# Altium schematic symbol library Regulator_Switching.SchLib: 1120 symbols (part 1 of 8) (continued)
## CRE1S0505SC (continued)
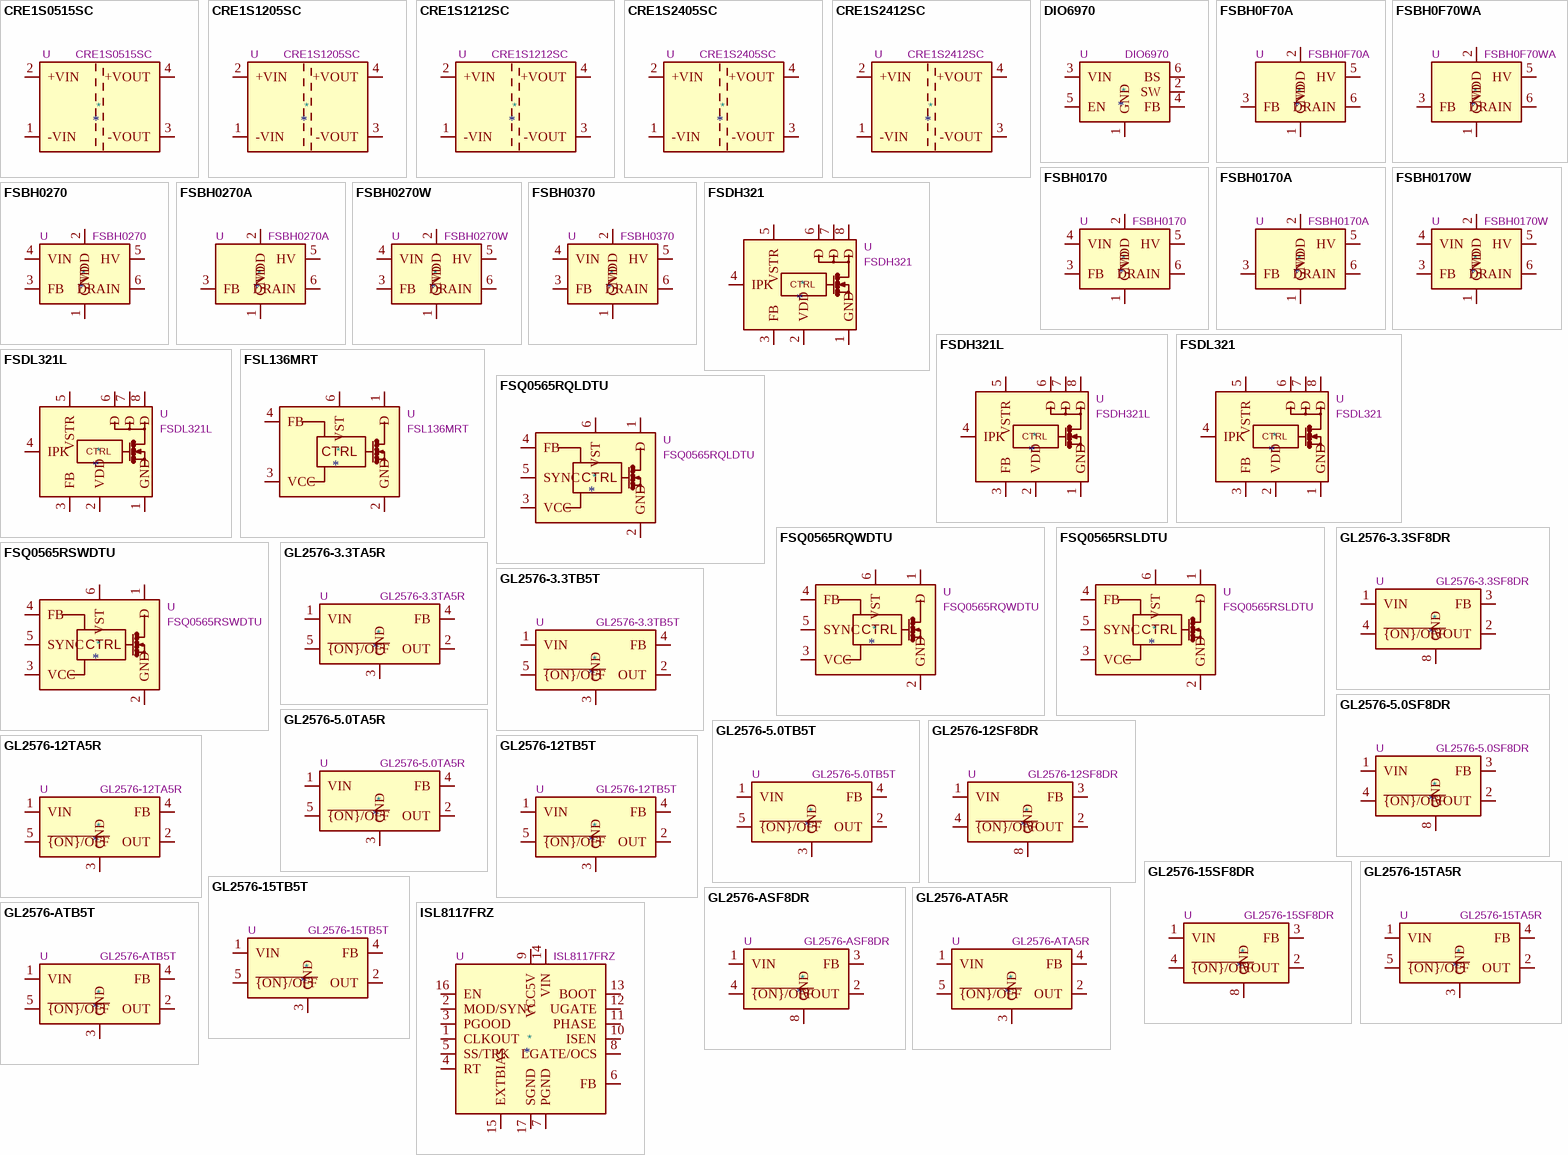
[diagram p2: symbols CRE1S0515SC to ISL8117FRZ]

## CRE1S0515SC
designator *  value CRE1S0515SC  Reference: U
ki_keywords: Murata isolated isolation dc-dc converter transformer; ki_description: 15V to 5V 67mA DC-DC Converter with 1kV isolation, SIP-4; ki_fp_filters: Converter*DCDC*Murata*CRE1xxxxxxSC*; Footprint: Converter_DCDC:Converter_DCDC_Murata_CRE1xxxxxxSC_THT; Datasheet: http://power.murata.com/datasheet?/data/power/ncl/kdc_cre1.pdf
pins: 1 -VIN, 2 +VIN, 3 -VOUT, 4 +VOUT

## CRE1S1205SC
designator *  value CRE1S1205SC  Reference: U
ki_keywords: Murata isolated isolation dc-dc converter transformer; ki_description: 12V to 5V 200mA DC-DC Converter with 1kV isolation, SIP-4; ki_fp_filters: Converter*DCDC*Murata*CRE1xxxxxxSC*; Footprint: Converter_DCDC:Converter_DCDC_Murata_CRE1xxxxxxSC_THT; Datasheet: http://power.murata.com/datasheet?/data/power/ncl/kdc_cre1.pdf
pins: 1 -VIN, 2 +VIN, 3 -VOUT, 4 +VOUT

## CRE1S1212SC
designator *  value CRE1S1212SC  Reference: U
ki_keywords: Murata isolated isolation dc-dc converter transformer; ki_description: 12V to 12V 83mA DC-DC Converter with 1kV isolation, SIP-4; ki_fp_filters: Converter*DCDC*Murata*CRE1xxxxxxSC*; Footprint: Converter_DCDC:Converter_DCDC_Murata_CRE1xxxxxxSC_THT; Datasheet: http://power.murata.com/datasheet?/data/power/ncl/kdc_cre1.pdf
pins: 1 -VIN, 2 +VIN, 3 -VOUT, 4 +VOUT

## CRE1S2405SC
designator *  value CRE1S2405SC  Reference: U
ki_keywords: Murata isolated isolation dc-dc converter transformer; ki_description: 24V to 5V 200mA DC-DC Converter with 1kV isolation, SIP-4; ki_fp_filters: Converter*DCDC*Murata*CRE1xxxxxxSC*; Footprint: Converter_DCDC:Converter_DCDC_Murata_CRE1xxxxxxSC_THT; Datasheet: http://power.murata.com/datasheet?/data/power/ncl/kdc_cre1.pdf
pins: 1 -VIN, 2 +VIN, 3 -VOUT, 4 +VOUT

## CRE1S2412SC
designator *  value CRE1S2412SC  Reference: U
ki_keywords: Murata isolated isolation dc-dc converter transformer; ki_description: 24V to 12V 83mA DC-DC Converter with 1kV isolation, SIP-4; ki_fp_filters: Converter*DCDC*Murata*CRE1xxxxxxSC*; Footprint: Converter_DCDC:Converter_DCDC_Murata_CRE1xxxxxxSC_THT; Datasheet: http://power.murata.com/datasheet?/data/power/ncl/kdc_cre1.pdf
pins: 1 -VIN, 2 +VIN, 3 -VOUT, 4 +VOUT

## DIO6970
designator *  value DIO6970  Reference: U
ki_keywords: smps buck boost inverting; ki_description: High-Efficiency 2A, 24V Input Synchronous Step Down Converter, SOT-23-6; ki_fp_filters: SOT?23*; Footprint: Package_TO_SOT_SMD:SOT-23-6; Datasheet: http://www.dioo.com/uploads/product/20190313/7a4d03690a9be004035eb1035a429f24.pdf
pins: 1 GND, 2 SW, 3 VIN, 4 FB, 5 EN, 6 BS

## FSBH0F70A
designator *  value FSBH0F70A  Reference: U
ki_keywords: smps regulator; ki_description: Green Mode Fairchild Power Switch, 700V Vds, 0.5A Id, 10W/8W 230V/85-265V, DIP-8; ki_fp_filters: DIP*W7.62mm*; Footprint: Package_DIP:DIP-8_W7.62mm; Datasheet: https://www.onsemi.com/pub/Collateral/FSBH0270-D.PDF
pins: 1 GND, 2 VDD, 3 FB, 4 NC hidden, 5 HV, 6 DRAIN, 7 DRAIN hidden, 8 DRAIN hidden

## FSBH0F70WA
designator *  value FSBH0F70WA  Reference: U
ki_keywords: smps regulator; ki_description: Green Mode Fairchild Power Switch, 700V Vds, 0.5A Id, 10W/8W 230V/85-265V, DIP-8; ki_fp_filters: DIP*W7.62mm*; Footprint: Package_DIP:DIP-8_W7.62mm; Datasheet: http://www.onsemi.com/pub/Collateral/FSBH0270W-D.pdf
pins: 1 GND, 2 VDD, 3 FB, 4 NC hidden, 5 HV, 6 DRAIN, 7 DRAIN hidden, 8 DRAIN hidden

## FSBH0170
designator *  value FSBH0170  Reference: U
ki_keywords: smps regulator; ki_description: Green Mode Fairchild Power Switch, 700V Vds, 1.0A Id, 15W/13W 230V/85-265V, VIN Pin, DIP-8; ki_fp_filters: DIP*W7.62mm*; Footprint: Package_DIP:DIP-8_W7.62mm; Datasheet: https://www.onsemi.com/pub/Collateral/FSBH0270-D.PDF
pins: 1 GND, 2 VDD, 3 FB, 4 VIN, 5 HV, 6 DRAIN, 7 DRAIN hidden, 8 DRAIN hidden

## FSBH0170A
designator *  value FSBH0170A  Reference: U
ki_keywords: smps regulator; ki_description: Green Mode Fairchild Power Switch, 700V Vds, 1.0A Id, 15W/13W 230V/85-265V, DIP-8; ki_fp_filters: DIP*W7.62mm*; Footprint: Package_DIP:DIP-8_W7.62mm; Datasheet: https://www.onsemi.com/pub/Collateral/FSBH0270-D.PDF
pins: 1 GND, 2 VDD, 3 FB, 4 NC hidden, 5 HV, 6 DRAIN, 7 DRAIN hidden, 8 DRAIN hidden

## FSBH0170W
designator *  value FSBH0170W  Reference: U
ki_keywords: smps regulator; ki_description: Green Mode Fairchild Power Switch, 700V Vds, 1.0A Id, 15W/13W 230V/85-265V, VIN Pin, DIP-8; ki_fp_filters: DIP*W7.62mm*; Footprint: Package_DIP:DIP-8_W7.62mm; Datasheet: http://www.onsemi.com/pub/Collateral/FSBH0270W-D.pdf
pins: 1 GND, 2 VDD, 3 FB, 4 VIN, 5 HV, 6 DRAIN, 7 DRAIN hidden, 8 DRAIN hidden

## FSBH0270
designator *  value FSBH0270  Reference: U
ki_keywords: smps regulator; ki_description: Green Mode Fairchild Power Switch, 700V Vds, 2.0A Id, 20W/16W 230V/85-265V, VIN Pin, DIP-8; ki_fp_filters: DIP*W7.62mm*; Footprint: Package_DIP:DIP-8_W7.62mm; Datasheet: https://www.onsemi.com/pub/Collateral/FSBH0270-D.PDF
pins: 1 GND, 2 VDD, 3 FB, 4 VIN, 5 HV, 6 DRAIN, 7 DRAIN hidden, 8 DRAIN hidden

## FSBH0270A
designator *  value FSBH0270A  Reference: U
ki_keywords: smps regulator; ki_description: Green Mode Fairchild Power Switch, 700V Vds, 2.0A Id, 20W/16W 230V/85-265V, DIP-8; ki_fp_filters: DIP*W7.62mm*; Footprint: Package_DIP:DIP-8_W7.62mm; Datasheet: https://www.onsemi.com/pub/Collateral/FSBH0270-D.PDF
pins: 1 GND, 2 VDD, 3 FB, 4 NC hidden, 5 HV, 6 DRAIN, 7 DRAIN hidden, 8 DRAIN hidden

## FSBH0270W
designator *  value FSBH0270W  Reference: U
ki_keywords: smps regulator; ki_description: Green Mode Fairchild Power Switch, 700V Vds, 2.0A Id, 20W/16W 230V/85-265V, VIN Pin, DIP-8; ki_fp_filters: DIP*W7.62mm*; Footprint: Package_DIP:DIP-8_W7.62mm; Datasheet: http://www.onsemi.com/pub/Collateral/FSBH0270W-D.pdf
pins: 1 GND, 2 VDD, 3 FB, 4 VIN, 5 HV, 6 DRAIN, 7 DRAIN hidden, 8 DRAIN hidden

## FSBH0370
designator *  value FSBH0370  Reference: U
ki_keywords: smps regulator; ki_description: Green Mode Fairchild Power Switch, 700V Vds, 3.0A Id, 25W/19W 230V/85-265V, VIN Pin, DIP-8; ki_fp_filters: DIP*W7.62mm*; Footprint: Package_DIP:DIP-8_W7.62mm; Datasheet: https://www.onsemi.com/pub/Collateral/FSBH0270-D.PDF
pins: 1 GND, 2 VDD, 3 FB, 4 VIN, 5 HV, 6 DRAIN, 7 DRAIN hidden, 8 DRAIN hidden

## FSDH321
designator *  value FSDH321  Reference: U
ki_keywords: SMPS Controller with MOSFET 17W AC-DC; ki_description: 17W SMPS Controller, 100kHz, AC-DC, PDIP-8; ki_fp_filters: DIP*W7.62mm*; Footprint: Package_DIP:DIP-8_W7.62mm; Datasheet: https://www.onsemi.com/pub/Collateral/FSDH321JP-D.pdf
pins: 1 GND, 2 VDD, 3 FB, 4 IPK, 5 VSTR, 6 D, 7 D, 8 D
text: CTRL

## FSDH321L
designator *  value FSDH321L  Reference: U
ki_keywords: SMPS Controller with MOSFET 17W AC-DC; ki_description: 17W SMPS Controller, 100kHz, AC-DC, SMD-8; ki_fp_filters: Fairchild*LSOP*; Footprint: Package_DIP:Fairchild_LSOP-8; Datasheet: https://www.onsemi.com/pub/Collateral/FSDH321JP-D.pdf
pins: 1 GND, 2 VDD, 3 FB, 4 IPK, 5 VSTR, 6 D, 7 D, 8 D
text: CTRL

## FSDL321
designator *  value FSDL321  Reference: U
ki_keywords: SMPS Controller with MOSFET 17W AC-DC; ki_description: 17W SMPS Controller, 50kHz, AC-DC, PDIP-8; ki_fp_filters: DIP*W7.62mm*; Footprint: Package_DIP:DIP-8_W7.62mm; Datasheet: https://www.onsemi.com/pub/Collateral/FSDH321JP-D.pdf
pins: 1 GND, 2 VDD, 3 FB, 4 IPK, 5 VSTR, 6 D, 7 D, 8 D
text: CTRL

## FSDL321L
designator *  value FSDL321L  Reference: U
ki_keywords: SMPS Controller with MOSFET 17W AC-DC; ki_description: 17W SMPS Controller, 50kHz, AC-DC, SMD-8; ki_fp_filters: Fairchild*LSOP*; Footprint: Package_DIP:Fairchild_LSOP-8; Datasheet: https://www.onsemi.com/pub/Collateral/FSDH321JP-D.pdf
pins: 1 GND, 2 VDD, 3 FB, 4 IPK, 5 VSTR, 6 D, 7 D, 8 D
text: CTRL

## FSL136MRT
designator *  value FSL136MRT  Reference: U
ki_keywords: SMPS Controller 50W AC-DC; ki_description: 67kHz SMPS Controller w/ Soft Start, max. 50W AC-DC, TO-220F-6L; ki_fp_filters: Fairchild*TO*220F*6L*; Footprint: Package_TO_SOT_THT:Fairchild_TO-220F-6L; Datasheet: https://www.onsemi.com/pub/Collateral/FSL136MRT-D.pdf
pins: 1 D, 2 GND, 3 VCC, 4 FB, 6 VST
text: CTRL

## FSQ0565RQLDTU
designator *  value FSQ0565RQLDTU  Reference: U
ki_keywords: Quasi Resonant SMPS Controller 80W AC-DC; ki_description: 67kHz Quasi Resonant SMPS Controller w/ Soft Start, max. 80W AC-DC, TO-220F-6L (Formed); ki_fp_filters: Fairchild*TO*220F*6L*; Footprint: Package_TO_SOT_THT:Fairchild_TO-220F-6L; Datasheet: http://www.onsemi.com/pub/Collateral/FSQ0565RS-D.PDF
pins: 1 D, 2 GND, 3 VCC, 4 FB, 5 SYNC, 6 VST
text: CTRL

## FSQ0565RQWDTU
designator *  value FSQ0565RQWDTU  Reference: U
ki_keywords: Quasi Resonant SMPS Controller 80W AC-DC; ki_description: 67kHz Quasi Resonant SMPS Controller w/ Soft Start, max. 80W AC-DC, TO-220F-6L; ki_fp_filters: Fairchild*TO*220F*6L*; Footprint: Package_TO_SOT_THT:Fairchild_TO-220F-6L; Datasheet: http://www.onsemi.com/pub/Collateral/FSQ0565RS-D.PDF
pins: 1 D, 2 GND, 3 VCC, 4 FB, 5 SYNC, 6 VST
text: CTRL

## FSQ0565RSLDTU
designator *  value FSQ0565RSLDTU  Reference: U
ki_keywords: Quasi Resonant SMPS Controller 80W AC-DC; ki_description: 67kHz Quasi Resonant SMPS Controller w/ Soft Start, max. 80W AC-DC, TO-220F-6L (Formed); ki_fp_filters: Fairchild*TO*220F*6L*; Footprint: Package_TO_SOT_THT:Fairchild_TO-220F-6L; Datasheet: http://www.onsemi.com/pub/Collateral/FSQ0565RS-D.PDF
pins: 1 D, 2 GND, 3 VCC, 4 FB, 5 SYNC, 6 VST
text: CTRL

## FSQ0565RSWDTU
designator *  value FSQ0565RSWDTU  Reference: U
ki_keywords: Quasi Resonant SMPS Controller 80W AC-DC; ki_description: 67kHz Quasi Resonant SMPS Controller w/ Soft Start, max. 80W AC-DC, TO-220F-6L; ki_fp_filters: Fairchild*TO*220F*6L*; Footprint: Package_TO_SOT_THT:Fairchild_TO-220F-6L; Datasheet: http://www.onsemi.com/pub/Collateral/FSQ0565RS-D.PDF
pins: 1 D, 2 GND, 3 VCC, 4 FB, 5 SYNC, 6 VST
text: CTRL

## GL2576-3.3SF8DR
designator *  value GL2576-3.3SF8DR  Reference: U
ki_keywords: 3.3V 3A 52KHz Buck DC/DC; ki_description: 3.3V 3A, 52KHz Step Down Converter, SO-8; ki_fp_filters: SOIC*3.9x4.9mm*P1.27mm*; Footprint: Package_SO:SOIC-8_3.9x4.9mm_P1.27mm; Datasheet: http://www.dianyuan.com/bbs/u/54/437861181916300.pdf
pins: 1 VIN, 2 VOUT, 3 FB, 4 ~{{ON}/OFF}, 5 GND hidden, 6 GND hidden, 7 GND hidden, 8 GND

## GL2576-3.3TA5R
designator *  value GL2576-3.3TA5R  Reference: U
ki_keywords: 3.3V 3A 52KHz Buck DC/DC; ki_description: 3.3V 3A, 52KHz Step Down Converter, TO263-5 (D2-PAK); ki_fp_filters: TO?263*; Footprint: Package_TO_SOT_SMD:TO-263-5_TabPin3; Datasheet: http://www.dianyuan.com/bbs/u/54/437861181916300.pdf
pins: 1 VIN, 2 OUT, 3 GND, 4 FB, 5 ~{{ON}/OFF}

## GL2576-3.3TB5T
designator *  value GL2576-3.3TB5T  Reference: U
ki_keywords: 3.3V 3A 52KHz Buck DC/DC; ki_description: 3.3V 3A, 52KHz Step Down Converter, TO220-5; ki_fp_filters: TO?220*; Footprint: Package_TO_SOT_THT:TO-220-5_Vertical; Datasheet: http://www.dianyuan.com/bbs/u/54/437861181916300.pdf
pins: 1 VIN, 2 OUT, 3 GND, 4 FB, 5 ~{{ON}/OFF}

## GL2576-5.0SF8DR
designator *  value GL2576-5.0SF8DR  Reference: U
ki_keywords: 5V 3A 52KHz Buck DC/DC; ki_description: 5V 3A, 52KHz Step Down Converter, SO-8; ki_fp_filters: SOIC*3.9x4.9mm*P1.27mm*; Footprint: Package_SO:SOIC-8_3.9x4.9mm_P1.27mm; Datasheet: http://www.dianyuan.com/bbs/u/54/437861181916300.pdf
pins: 1 VIN, 2 VOUT, 3 FB, 4 ~{{ON}/OFF}, 5 GND hidden, 6 GND hidden, 7 GND hidden, 8 GND

## GL2576-5.0TA5R
designator *  value GL2576-5.0TA5R  Reference: U
ki_keywords: 5V 3A 52KHz Buck DC/DC; ki_description: 5V 3A, 52KHz Step Down Converter, TO263-5 (D2-PAK); ki_fp_filters: TO?263*; Footprint: Package_TO_SOT_SMD:TO-263-5_TabPin3; Datasheet: http://www.dianyuan.com/bbs/u/54/437861181916300.pdf
pins: 1 VIN, 2 OUT, 3 GND, 4 FB, 5 ~{{ON}/OFF}

## GL2576-5.0TB5T
designator *  value GL2576-5.0TB5T  Reference: U
ki_keywords: 5V 3A 52KHz Buck DC/DC; ki_description: 5V 3A, 52KHz Step Down Converter, TO220-5; ki_fp_filters: TO?220*; Footprint: Package_TO_SOT_THT:TO-220-5_Vertical; Datasheet: http://www.dianyuan.com/bbs/u/54/437861181916300.pdf
pins: 1 VIN, 2 OUT, 3 GND, 4 FB, 5 ~{{ON}/OFF}

## GL2576-12SF8DR
designator *  value GL2576-12SF8DR  Reference: U
ki_keywords: 12V 3A 52KHz Buck DC/DC; ki_description: 12V 3A, 52KHz Step Down Converter, SO-8; ki_fp_filters: SOIC*3.9x4.9mm*P1.27mm*; Footprint: Package_SO:SOIC-8_3.9x4.9mm_P1.27mm; Datasheet: http://www.dianyuan.com/bbs/u/54/437861181916300.pdf
pins: 1 VIN, 2 VOUT, 3 FB, 4 ~{{ON}/OFF}, 5 GND hidden, 6 GND hidden, 7 GND hidden, 8 GND

## GL2576-12TA5R
designator *  value GL2576-12TA5R  Reference: U
ki_keywords: 12V 3A 52KHz Buck DC/DC; ki_description: 12V 3A, 52KHz Step Down Converter, TO263-5 (D2-PAK); ki_fp_filters: TO?263*; Footprint: Package_TO_SOT_SMD:TO-263-5_TabPin3; Datasheet: http://www.dianyuan.com/bbs/u/54/437861181916300.pdf
pins: 1 VIN, 2 OUT, 3 GND, 4 FB, 5 ~{{ON}/OFF}

## GL2576-12TB5T
designator *  value GL2576-12TB5T  Reference: U
ki_keywords: 12V 3A 52KHz Buck DC/DC; ki_description: 12V 3A, 52KHz Step Down Converter, TO220-5; ki_fp_filters: TO?220*; Footprint: Package_TO_SOT_THT:TO-220-5_Vertical; Datasheet: http://www.dianyuan.com/bbs/u/54/437861181916300.pdf
pins: 1 VIN, 2 OUT, 3 GND, 4 FB, 5 ~{{ON}/OFF}

## GL2576-15SF8DR
designator *  value GL2576-15SF8DR  Reference: U
ki_keywords: 15V 3A 52KHz Buck DC/DC; ki_description: 15V 3A, 52KHz Step Down Converter, SO-8; ki_fp_filters: SOIC*3.9x4.9mm*P1.27mm*; Footprint: Package_SO:SOIC-8_3.9x4.9mm_P1.27mm; Datasheet: http://www.dianyuan.com/bbs/u/54/437861181916300.pdf
pins: 1 VIN, 2 VOUT, 3 FB, 4 ~{{ON}/OFF}, 5 GND hidden, 6 GND hidden, 7 GND hidden, 8 GND

## GL2576-15TA5R
designator *  value GL2576-15TA5R  Reference: U
ki_keywords: 15V 3A 52KHz Buck DC/DC; ki_description: 15V 3A, 52KHz Step Down Converter, TO263-5 (D2-PAK); ki_fp_filters: TO?263*; Footprint: Package_TO_SOT_SMD:TO-263-5_TabPin3; Datasheet: http://www.dianyuan.com/bbs/u/54/437861181916300.pdf
pins: 1 VIN, 2 OUT, 3 GND, 4 FB, 5 ~{{ON}/OFF}

## GL2576-15TB5T
designator *  value GL2576-15TB5T  Reference: U
ki_keywords: 15V 3A 52KHz Buck DC/DC; ki_description: 15V 3A, 52KHz Step Down Converter, TO220-5; ki_fp_filters: TO?220*; Footprint: Package_TO_SOT_THT:TO-220-5_Vertical; Datasheet: http://www.dianyuan.com/bbs/u/54/437861181916300.pdf
pins: 1 VIN, 2 OUT, 3 GND, 4 FB, 5 ~{{ON}/OFF}

## GL2576-ASF8DR
designator *  value GL2576-ASF8DR  Reference: U
ki_keywords: Adjustable 3A 52KHz Buck DC/DC; ki_description: Adjustable 3A, 52KHz Step Down Converter, SO-8; ki_fp_filters: SOIC*3.9x4.9mm*P1.27mm*; Footprint: Package_SO:SOIC-8_3.9x4.9mm_P1.27mm; Datasheet: http://www.dianyuan.com/bbs/u/54/437861181916300.pdf
pins: 1 VIN, 2 VOUT, 3 FB, 4 ~{{ON}/OFF}, 5 GND hidden, 6 GND hidden, 7 GND hidden, 8 GND

## GL2576-ATA5R
designator *  value GL2576-ATA5R  Reference: U
ki_keywords: Adjustable 3A 52KHz Buck DC/DC; ki_description: Adjustable 3A, 52KHz Step Down Converter, TO263-5 (D2-PAK); ki_fp_filters: TO?263*; Footprint: Package_TO_SOT_SMD:TO-263-5_TabPin3; Datasheet: http://www.dianyuan.com/bbs/u/54/437861181916300.pdf
pins: 1 VIN, 2 OUT, 3 GND, 4 FB, 5 ~{{ON}/OFF}

## GL2576-ATB5T
designator *  value GL2576-ATB5T  Reference: U
ki_keywords: Adjustable 3A 52KHz Buck DC/DC; ki_description: Adjustable 3A, 52KHz Step Down Converter, TO220-5; ki_fp_filters: TO?220*; Footprint: Package_TO_SOT_THT:TO-220-5_Vertical; Datasheet: http://www.dianyuan.com/bbs/u/54/437861181916300.pdf
pins: 1 VIN, 2 OUT, 3 GND, 4 FB, 5 ~{{ON}/OFF}

## ISL8117FRZ
designator *  value ISL8117FRZ  Reference: U
ki_keywords: PWM step down buck converter controller synchronous POL; ki_description: Synchronous step-down PWM controller, 4.5v to 60v input, 0.6v to 54v Output Voltage, QFN-16; ki_fp_filters: QFN*1EP*4x4mm*P0.5mm*; Footprint: Package_DFN_QFN:QFN-16-1EP_4x4mm_P0.5mm_EP2.45x2.45mm; Datasheet: https://www.intersil.com/content/dam/Intersil/documents/isl8/isl8117.pdf
pins: 1 CLKOUT, 2 MOD/SYNC, 3 PGOOD, 4 RT, 5 SS/TRK, 6 FB, 7 PGND, 8 LGATE/OCS, 9 VCC5V, 10 ISEN, 11 PHASE, 12 UGATE, 13 BOOT, 14 VIN, 15 EXTBIAS, 16 EN, 17 SGND

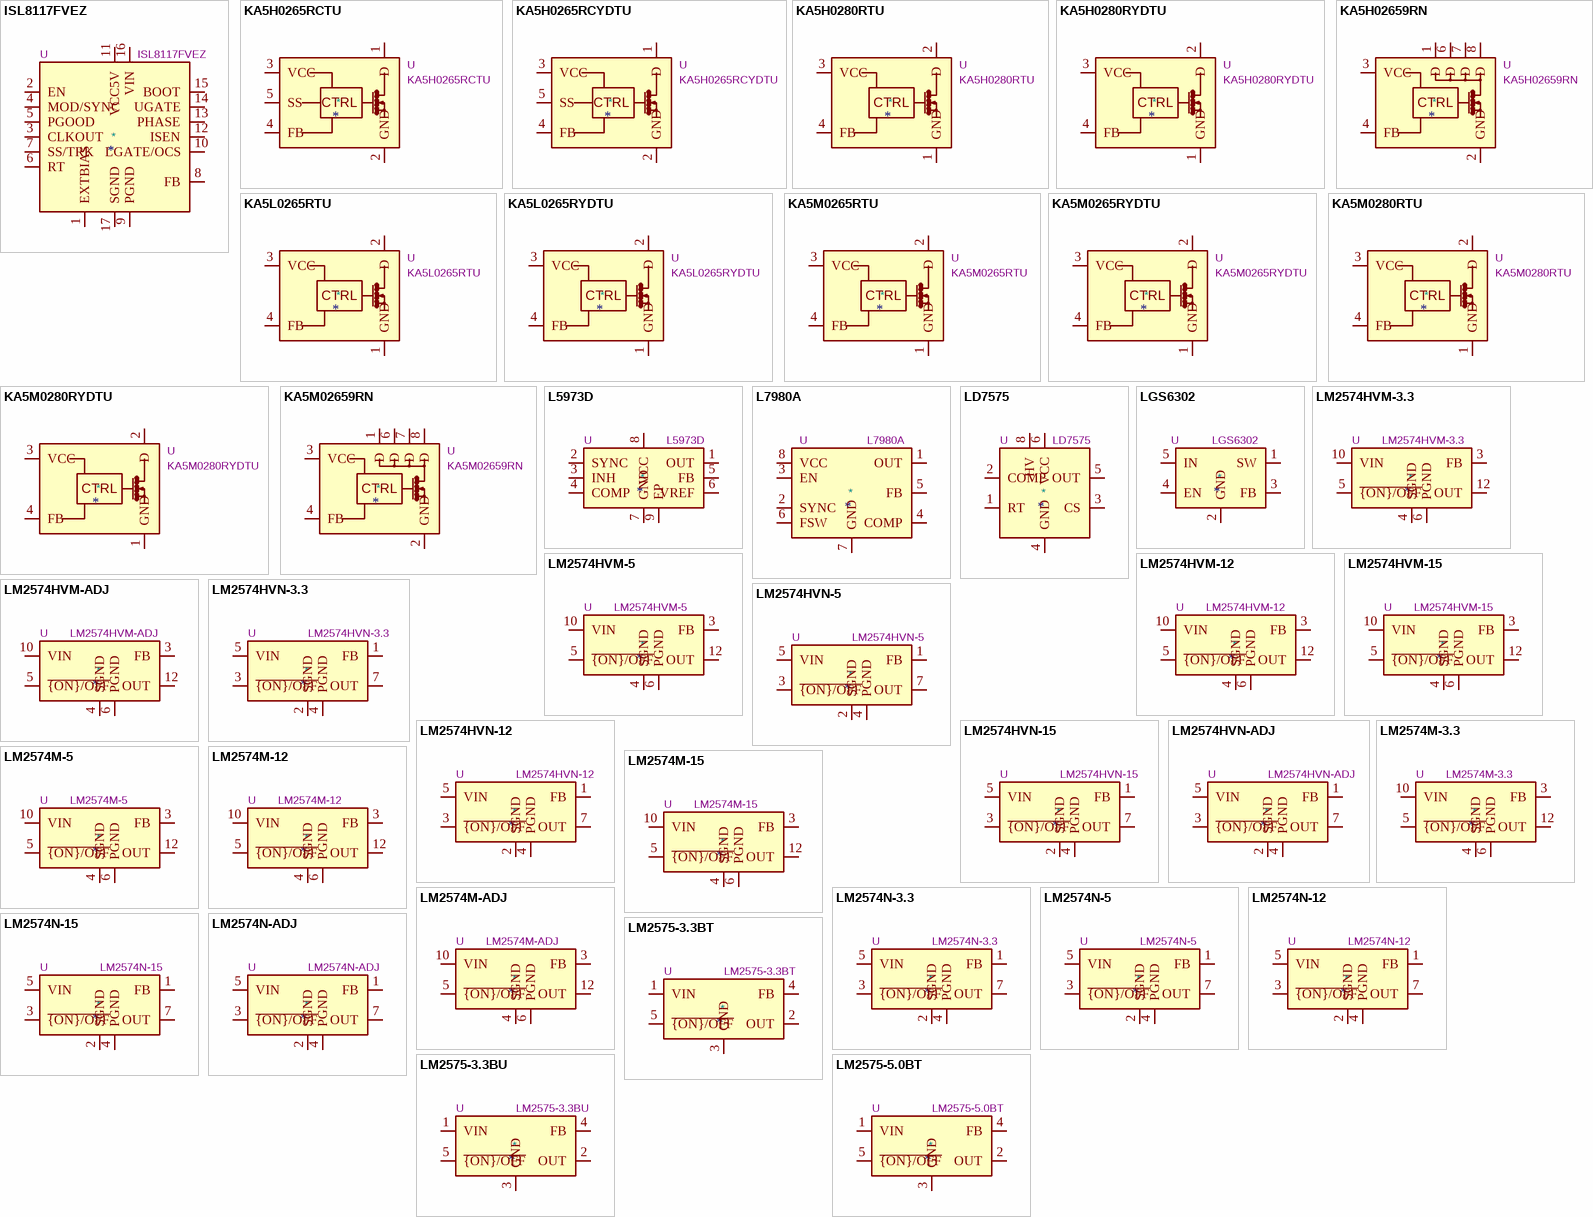
[diagram p3: symbols ISL8117FVEZ to LM2575-5.0BT]

## ISL8117FVEZ
designator *  value ISL8117FVEZ  Reference: U
ki_keywords: PWM step down buck converter controller synchronous POL; ki_description: Synchronous step-down PWM controller, 4.5v to 60v input, 0.6v to 54v Output Voltage, HTSSOP-16; ki_fp_filters: HTSSOP*EP*4.4x5mm*P0.65mm*; Footprint: Package_SO:HTSSOP-16-1EP_4.4x5mm_P0.65mm_EP3.4x5mm; Datasheet: https://www.intersil.com/content/dam/Intersil/documents/isl8/isl8117.pdf
pins: 1 EXTBIAS, 2 EN, 3 CLKOUT, 4 MOD/SYNC, 5 PGOOD, 6 RT, 7 SS/TRK, 8 FB, 9 PGND, 10 LGATE/OCS, 11 VCC5V, 12 ISEN, 13 PHASE, 14 UGATE, 15 BOOT, 16 VIN, 17 SGND

## KA5H0265RCTU
designator *  value KA5H0265RCTU  Reference: U
ki_keywords: SMPS Controller AC-DC; ki_description: 100kHz SMPS Controller w/ Soft Start, AC-DC, TO-220F-5L; ki_fp_filters: *TO*220*5L*; Footprint: Package_TO_SOT_THT:ONSemi_TO-220-5L; Datasheet: http://www.onsemi.com/pub/Collateral/KA5L0265R-D.PDF
pins: 1 D, 2 GND, 3 VCC, 4 FB, 5 SS
text: CTRL

## KA5H0265RCYDTU
designator *  value KA5H0265RCYDTU  Reference: U
ki_keywords: SMPS Controller AC-DC; ki_description: KA5H0265RCTU, 100kHz SMPS Controller w/ Soft Start, AC-DC, TO-220F-5L(Forming); ki_fp_filters: *TO*220*5L*; Footprint: Package_TO_SOT_THT:ONSemi_TO-220-5L_Forming; Datasheet: http://www.onsemi.com/pub/Collateral/KA5L0265R-D.PDF
pins: 1 D, 2 GND, 3 VCC, 4 FB, 5 SS
text: CTRL

## KA5H0280RTU
designator *  value KA5H0280RTU  Reference: U
ki_keywords: SMPS Controller AC-DC; ki_description: 100kHz SMPS Controller, AC-DC, TO-220F-4L; ki_fp_filters: *TO*220*4*; Footprint: Package_TO_SOT_THT:TO-220-4_Vertical; Datasheet: http://www.onsemi.com/pub/Collateral/KA5L0265R-D.PDF
pins: 1 GND, 2 D, 3 VCC, 4 FB
text: CTRL

## KA5H0280RYDTU
designator *  value KA5H0280RYDTU  Reference: U
ki_keywords: SMPS Controller AC-DC; ki_description: 100kHz SMPS Controller, AC-DC, TO-220F-4L(Forming); ki_fp_filters: *TO*220*4*; Footprint: Package_TO_SOT_THT:ONSemi_TO-220F-4L_Forming; Datasheet: http://www.onsemi.com/pub/Collateral/KA5L0265R-D.PDF
pins: 1 GND, 2 D, 3 VCC, 4 FB
text: CTRL

## KA5H02659RN
designator *  value KA5H02659RN  Reference: U
ki_keywords: SMPS Controller AC-DC; ki_description: 100kHz SMPS Controller, AC-DC, PDIP-8; ki_fp_filters: DIP*8*W7.62mm*; Footprint: Package_DIP:DIP-8_W7.62mm; Datasheet: http://www.onsemi.com/pub/Collateral/KA5L0265R-D.PDF
pins: 1 D, 2 GND, 3 VCC, 4 FB, 6 D, 7 D, 8 D
text: CTRL

## KA5L0265RTU
designator *  value KA5L0265RTU  Reference: U
ki_keywords: SMPS Controller AC-DC; ki_description: 50kHz SMPS Controller, AC-DC, TO-220F-4L; ki_fp_filters: *TO*220*4*; Footprint: Package_TO_SOT_THT:TO-220-4_Vertical; Datasheet: http://www.onsemi.com/pub/Collateral/KA5L0265R-D.PDF
pins: 1 GND, 2 D, 3 VCC, 4 FB
text: CTRL

## KA5L0265RYDTU
designator *  value KA5L0265RYDTU  Reference: U
ki_keywords: SMPS Controller AC-DC; ki_description: 50kHz SMPS Controller, AC-DC, TO-220F-4L(Forming); ki_fp_filters: *TO*220*4*; Footprint: Package_TO_SOT_THT:ONSemi_TO-220F-4L_Forming; Datasheet: http://www.onsemi.com/pub/Collateral/KA5L0265R-D.PDF
pins: 1 GND, 2 D, 3 VCC, 4 FB
text: CTRL

## KA5M0265RTU
designator *  value KA5M0265RTU  Reference: U
ki_keywords: SMPS Controller AC-DC; ki_description: 67kHz SMPS Controller, AC-DC, TO-220F-4L; ki_fp_filters: *TO*220*4*; Footprint: Package_TO_SOT_THT:TO-220-4_Vertical; Datasheet: http://www.onsemi.com/pub/Collateral/KA5L0265R-D.PDF
pins: 1 GND, 2 D, 3 VCC, 4 FB
text: CTRL

## KA5M0265RYDTU
designator *  value KA5M0265RYDTU  Reference: U
ki_keywords: SMPS Controller AC-DC; ki_description: 67kHz SMPS Controller, AC-DC, TO-220F-4L(Forming); ki_fp_filters: *TO*220*4*; Footprint: Package_TO_SOT_THT:ONSemi_TO-220F-4L_Forming; Datasheet: http://www.onsemi.com/pub/Collateral/KA5L0265R-D.PDF
pins: 1 GND, 2 D, 3 VCC, 4 FB
text: CTRL

## KA5M0280RTU
designator *  value KA5M0280RTU  Reference: U
ki_keywords: SMPS Controller AC-DC; ki_description: 67kHz SMPS Controller, AC-DC, TO-220F-4L; ki_fp_filters: *TO*220*4*; Footprint: Package_TO_SOT_THT:TO-220-4_Vertical; Datasheet: http://www.onsemi.com/pub/Collateral/KA5L0265R-D.PDF
pins: 1 GND, 2 D, 3 VCC, 4 FB
text: CTRL

## KA5M0280RYDTU
designator *  value KA5M0280RYDTU  Reference: U
ki_keywords: SMPS Controller AC-DC; ki_description: KA5M0280RTDTU, 67kHz SMPS Controller, AC-DC, TO-220F-4L(Forming); ki_fp_filters: *TO*220*4*; Footprint: Package_TO_SOT_THT:ONSemi_TO-220F-4L_Forming; Datasheet: http://www.onsemi.com/pub/Collateral/KA5L0265R-D.PDF
pins: 1 GND, 2 D, 3 VCC, 4 FB
text: CTRL

## KA5M02659RN
designator *  value KA5M02659RN  Reference: U
ki_keywords: SMPS Controller AC-DC; ki_description: 67kHz SMPS Controller, AC-DC, PDIP-8; ki_fp_filters: DIP*8*W7.62mm*; Footprint: Package_DIP:DIP-8_W7.62mm; Datasheet: http://www.onsemi.com/pub/Collateral/KA5L0265R-D.PDF
pins: 1 D, 2 GND, 3 VCC, 4 FB, 6 D, 7 D, 8 D
text: CTRL

## L5973D
designator *  value L5973D  Reference: U
ki_keywords: step down buck regulator; ki_description: 2.5A step down switching regulator, HSOP-8; ki_fp_filters: HSOP*EP*3.9x4.9mm*P1.27mm*; Footprint: Package_SO:HSOP-8-1EP_3.9x4.9mm_P1.27mm_EP2.41x3.1mm_ThermalVias; Datasheet: http://www.st.com/resource/en/datasheet/l5973d.pdf
pins: 1 OUT, 2 SYNC, 3 INH, 4 COMP, 5 FB, 6 VREF, 7 GND, 8 VCC, 9 EP

## L7980A
designator *  value L7980A  Reference: U
ki_keywords: step down buck regulator; ki_description: 2A step down switching regulator, HSOP-8; ki_fp_filters: HSOP*EP*3.9x4.9mm*P1.27mm*; Footprint: Package_SO:HSOP-8-1EP_3.9x4.9mm_P1.27mm_EP2.3x2.3mm; Datasheet: https://www.st.com/resource/en/datasheet/l7980.pdf
pins: 1 OUT, 2 SYNC, 3 EN, 4 COMP, 5 FB, 6 FSW, 7 GND, 8 VCC, 9 GND hidden

## LD7575
designator *  value LD7575  Reference: U
ki_keywords: smps controller; ki_description: Green-Mode PWM Controller with High-Voltage Start-Up Circuit, DIP-8/SOIC-8; ki_fp_filters: SOIC*3.9x4.9mm*P1.27mm* DIP*W7.62mm*; Datasheet: http://www.leadtrend.com.tw/archive/doc/product/sheets/LD7575-DS-04b.pdf
pins: 1 RT, 2 COMP, 3 CS, 4 GND, 5 OUT, 6 VCC, 7 NC hidden, 8 HV

## LGS6302
designator *  value LGS6302  Reference: U
ki_keywords: 1.5A Buck DC/DC; ki_description: 1.5A, 1.2MHz Boost DC/DC Converter, adjustable 3-60V output voltage, SOT-23-5; ki_fp_filters: SOT?23*; Footprint: Package_TO_SOT_SMD:SOT-23-5; Datasheet: https://datasheet.lcsc.com/lcsc/2304071430_Legend-Si-LGS6302_C5123975.pdf
pins: 1 SW, 2 GND, 3 FB, 4 EN, 5 IN

## LM2574HVM-3.3
designator *  value LM2574HVM-3.3  Reference: U
ki_keywords: Step-Down Voltage Regulator 3.3V 500mA HV; ki_description: 3.3V, 0.5A SIMPLE SWITCHER® Step-Down Voltage Regulator, High Voltage Input, SO-8; ki_fp_filters: SOIC*7.5x9mm*P1.27mm*; Footprint: Package_SO:SOIC-14W_7.5x9mm_P1.27mm; Datasheet: http://www.national.com/ds/LM/LM2574.pdf
pins: 3 FB, 4 SGND, 5 ~{{ON}/OFF}, 6 PGND, 10 VIN, 12 OUT

## LM2574HVM-5
designator *  value LM2574HVM-5  Reference: U
ki_keywords: Step-Down Voltage Regulator 5V 500mA HV; ki_description: 5V, 0.5A SIMPLE SWITCHER® Step-Down Voltage Regulator, High Voltage Input, SO-8; ki_fp_filters: SOIC*7.5x9mm*P1.27mm*; Footprint: Package_SO:SOIC-14W_7.5x9mm_P1.27mm; Datasheet: http://www.national.com/ds/LM/LM2574.pdf
pins: 3 FB, 4 SGND, 5 ~{{ON}/OFF}, 6 PGND, 10 VIN, 12 OUT

## LM2574HVM-12
designator *  value LM2574HVM-12  Reference: U
ki_keywords: Step-Down Voltage Regulator 12V 500mA HV; ki_description: 12V, 0.5A Step-Down Voltage Regulator, High Voltage Input, SO-8; ki_fp_filters: SOIC*7.5x9mm*P1.27mm*; Footprint: Package_SO:SOIC-14W_7.5x9mm_P1.27mm; Datasheet: http://www.ti.com/lit/ds/symlink/lm2574.pdf
pins: 3 FB, 4 SGND, 5 ~{{ON}/OFF}, 6 PGND, 10 VIN, 12 OUT

## LM2574HVM-15
designator *  value LM2574HVM-15  Reference: U
ki_keywords: Step-Down Voltage Regulator 15V 500mA HV; ki_description: 15V, 0.5A SIMPLE SWITCHER® Step-Down Voltage Regulator, High Voltage Input, SO-8; ki_fp_filters: SOIC*7.5x9mm*P1.27mm*; Footprint: Package_SO:SOIC-14W_7.5x9mm_P1.27mm; Datasheet: http://www.national.com/ds/LM/LM2574.pdf
pins: 3 FB, 4 SGND, 5 ~{{ON}/OFF}, 6 PGND, 10 VIN, 12 OUT

## LM2574HVM-ADJ
designator *  value LM2574HVM-ADJ  Reference: U
ki_keywords: Step-Down Voltage Regulator Adjustable 500mA HV; ki_description: Adjustable Output Voltage, 0.5A SIMPLE SWITCHER® Step-Down Voltage Regulator, High Voltage Input, SO-8; ki_fp_filters: SOIC*7.5x9mm*P1.27mm*; Footprint: Package_SO:SOIC-14W_7.5x9mm_P1.27mm; Datasheet: http://www.national.com/ds/LM/LM2574.pdf
pins: 3 FB, 4 SGND, 5 ~{{ON}/OFF}, 6 PGND, 10 VIN, 12 OUT

## LM2574HVN-3.3
designator *  value LM2574HVN-3.3  Reference: U
ki_keywords: Step-Down Voltage Regulator 3.3V 500mA HV; ki_description: 3.3V, 0.5A SIMPLE SWITCHER® Step-Down Voltage Regulator, High Voltage Input, DIP-8; ki_fp_filters: DIP*W7.62mm*; Footprint: Package_DIP:DIP-8_W7.62mm; Datasheet: http://www.national.com/ds/LM/LM2574.pdf
pins: 1 FB, 2 SGND, 3 ~{{ON}/OFF}, 4 PGND, 5 VIN, 6 NC hidden, 7 OUT, 8 NC hidden

## LM2574HVN-5
designator *  value LM2574HVN-5  Reference: U
ki_keywords: Step-Down Voltage Regulator 5V 500mA HV; ki_description: 5V, 0.5A SIMPLE SWITCHER® Step-Down Voltage Regulator, High Voltage Input, DIP-8; ki_fp_filters: DIP*W7.62mm*; Footprint: Package_DIP:DIP-8_W7.62mm; Datasheet: http://www.national.com/ds/LM/LM2574.pdf
pins: 1 FB, 2 SGND, 3 ~{{ON}/OFF}, 4 PGND, 5 VIN, 6 NC hidden, 7 OUT, 8 NC hidden

## LM2574HVN-12
designator *  value LM2574HVN-12  Reference: U
ki_keywords: Step-Down Voltage Regulator 12V 500mA HV; ki_description: 12V, 0.5A Step-Down Voltage Regulator, High Voltage Input, DIP-8; ki_fp_filters: DIP*W7.62mm*; Footprint: Package_DIP:DIP-8_W7.62mm; Datasheet: http://www.ti.com/lit/ds/symlink/lm2574.pdf
pins: 1 FB, 2 SGND, 3 ~{{ON}/OFF}, 4 PGND, 5 VIN, 6 NC hidden, 7 OUT, 8 NC hidden

## LM2574HVN-15
designator *  value LM2574HVN-15  Reference: U
ki_keywords: Step-Down Voltage Regulator 15V 500mA HV; ki_description: 15V, 0.5A SIMPLE SWITCHER® Step-Down Voltage Regulator, High Voltage Input, DIP-8; ki_fp_filters: DIP*W7.62mm*; Footprint: Package_DIP:DIP-8_W7.62mm; Datasheet: http://www.national.com/ds/LM/LM2574.pdf
pins: 1 FB, 2 SGND, 3 ~{{ON}/OFF}, 4 PGND, 5 VIN, 6 NC hidden, 7 OUT, 8 NC hidden

## LM2574HVN-ADJ
designator *  value LM2574HVN-ADJ  Reference: U
ki_keywords: Step-Down Voltage Regulator Adjustable 500mA HV; ki_description: Adjustable Output Voltage, 0.5A SIMPLE SWITCHER® Step-Down Voltage Regulator, High Voltage Input, DIP-8; ki_fp_filters: DIP*W7.62mm*; Footprint: Package_DIP:DIP-8_W7.62mm; Datasheet: http://www.national.com/ds/LM/LM2574.pdf
pins: 1 FB, 2 SGND, 3 ~{{ON}/OFF}, 4 PGND, 5 VIN, 6 NC hidden, 7 OUT, 8 NC hidden

## LM2574M-3.3
designator *  value LM2574M-3.3  Reference: U
ki_keywords: Step-Down Voltage Regulator 3.3V 500mA; ki_description: 3.3V, 0.5A SIMPLE SWITCHER® Step-Down Voltage Regulator, SO-8; ki_fp_filters: SOIC*7.5x9mm*P1.27mm*; Footprint: Package_SO:SOIC-14W_7.5x9mm_P1.27mm; Datasheet: http://www.national.com/ds/LM/LM2574.pdf
pins: 3 FB, 4 SGND, 5 ~{{ON}/OFF}, 6 PGND, 10 VIN, 12 OUT

## LM2574M-5
designator *  value LM2574M-5  Reference: U
ki_keywords: Step-Down Voltage Regulator 5V 500mA; ki_description: 5V, 0.5A SIMPLE SWITCHER® Step-Down Voltage Regulator, SO-8; ki_fp_filters: SOIC*7.5x9mm*P1.27mm*; Footprint: Package_SO:SOIC-14W_7.5x9mm_P1.27mm; Datasheet: http://www.national.com/ds/LM/LM2574.pdf
pins: 3 FB, 4 SGND, 5 ~{{ON}/OFF}, 6 PGND, 10 VIN, 12 OUT

## LM2574M-12
designator *  value LM2574M-12  Reference: U
ki_keywords: Step-Down Voltage Regulator 12V 500mA; ki_description: 12V, 0.5A SIMPLE SWITCHER® Step-Down Voltage Regulator, SO-8; ki_fp_filters: SOIC*7.5x9mm*P1.27mm*; Footprint: Package_SO:SOIC-14W_7.5x9mm_P1.27mm; Datasheet: http://www.national.com/ds/LM/LM2574.pdf
pins: 3 FB, 4 SGND, 5 ~{{ON}/OFF}, 6 PGND, 10 VIN, 12 OUT

## LM2574M-15
designator *  value LM2574M-15  Reference: U
ki_keywords: Step-Down Voltage Regulator 15V 500mA; ki_description: 15V, 0.5A SIMPLE SWITCHER® Step-Down Voltage Regulator, SO-8; ki_fp_filters: SOIC*7.5x9mm*P1.27mm*; Footprint: Package_SO:SOIC-14W_7.5x9mm_P1.27mm; Datasheet: http://www.national.com/ds/LM/LM2574.pdf
pins: 3 FB, 4 SGND, 5 ~{{ON}/OFF}, 6 PGND, 10 VIN, 12 OUT

## LM2574M-ADJ
designator *  value LM2574M-ADJ  Reference: U
ki_keywords: Step-Down Voltage Regulator Adjustable 500mA; ki_description: Adjustable Output Voltage, 0.5A SIMPLE SWITCHER® Step-Down Voltage Regulator, SO-8; ki_fp_filters: SOIC*7.5x9mm*P1.27mm*; Footprint: Package_SO:SOIC-14W_7.5x9mm_P1.27mm; Datasheet: http://www.national.com/ds/LM/LM2574.pdf
pins: 3 FB, 4 SGND, 5 ~{{ON}/OFF}, 6 PGND, 10 VIN, 12 OUT

## LM2574N-3.3
designator *  value LM2574N-3.3  Reference: U
ki_keywords: Step-Down Voltage Regulator 3.3V 500mA; ki_description: 3.3V, 0.5A SIMPLE SWITCHER® Step-Down Voltage Regulator, DIP-8; ki_fp_filters: DIP*W7.62mm*; Footprint: Package_DIP:DIP-8_W7.62mm; Datasheet: http://www.national.com/ds/LM/LM2574.pdf
pins: 1 FB, 2 SGND, 3 ~{{ON}/OFF}, 4 PGND, 5 VIN, 6 NC hidden, 7 OUT, 8 NC hidden

## LM2574N-5
designator *  value LM2574N-5  Reference: U
ki_keywords: Step-Down Voltage Regulator 5V 500mA; ki_description: 5V, 0.5A SIMPLE SWITCHER® Step-Down Voltage Regulator, DIP-8; ki_fp_filters: DIP*W7.62mm*; Footprint: Package_DIP:DIP-8_W7.62mm; Datasheet: http://www.national.com/ds/LM/LM2574.pdf
pins: 1 FB, 2 SGND, 3 ~{{ON}/OFF}, 4 PGND, 5 VIN, 6 NC hidden, 7 OUT, 8 NC hidden

## LM2574N-12
designator *  value LM2574N-12  Reference: U
ki_keywords: Step-Down Voltage Regulator 12V 500mA; ki_description: 12V, 0.5A SIMPLE SWITCHER® Step-Down Voltage Regulator, DIP-8; ki_fp_filters: DIP*W7.62mm*; Footprint: Package_DIP:DIP-8_W7.62mm; Datasheet: http://www.national.com/ds/LM/LM2574.pdf
pins: 1 FB, 2 SGND, 3 ~{{ON}/OFF}, 4 PGND, 5 VIN, 6 NC hidden, 7 OUT, 8 NC hidden

## LM2574N-15
designator *  value LM2574N-15  Reference: U
ki_keywords: Step-Down Voltage Regulator 15V 500mA; ki_description: 15V, 0.5A SIMPLE SWITCHER® Step-Down Voltage Regulator, DIP-8; ki_fp_filters: DIP*W7.62mm*; Footprint: Package_DIP:DIP-8_W7.62mm; Datasheet: http://www.national.com/ds/LM/LM2574.pdf
pins: 1 FB, 2 SGND, 3 ~{{ON}/OFF}, 4 PGND, 5 VIN, 6 NC hidden, 7 OUT, 8 NC hidden

## LM2574N-ADJ
designator *  value LM2574N-ADJ  Reference: U
ki_keywords: Step-Down Voltage Regulator Adjustable 500mA; ki_description: Adjustable Output Voltage, 0.5A SIMPLE SWITCHER® Step-Down Voltage Regulator, DIP-8; ki_fp_filters: DIP*W7.62mm*; Footprint: Package_DIP:DIP-8_W7.62mm; Datasheet: http://www.national.com/ds/LM/LM2574.pdf
pins: 1 FB, 2 SGND, 3 ~{{ON}/OFF}, 4 PGND, 5 VIN, 6 NC hidden, 7 OUT, 8 NC hidden

## LM2575-3.3BT
designator *  value LM2575-3.3BT  Reference: U
ki_keywords: Buck regulator Switcher; ki_description: Fixed 3.3V 52kHz Simple 1A Buck Regulator, TO-220-5; ki_fp_filters: TO?220*; Footprint: Package_TO_SOT_THT:TO-220-5_Vertical; Datasheet: http://ww1.microchip.com/downloads/en/DeviceDoc/lm2575.pdf
pins: 1 VIN, 2 OUT, 3 GND, 4 FB, 5 ~{{ON}/OFF}

## LM2575-3.3BU
designator *  value LM2575-3.3BU  Reference: U
ki_keywords: Buck regulator Switcher; ki_description: Fixed 3.3V 52kHz Simple 1A Buck Regulator, TO-263; ki_fp_filters: TO?263*; Footprint: Package_TO_SOT_SMD:TO-263-5_TabPin3; Datasheet: http://ww1.microchip.com/downloads/en/DeviceDoc/lm2575.pdf
pins: 1 VIN, 2 OUT, 3 GND, 4 FB, 5 ~{{ON}/OFF}

## LM2575-5.0BT
designator *  value LM2575-5.0BT  Reference: U
ki_keywords: Buck regulator Switcher; ki_description: Fixed 5.0V 52kHz Simple 1A Buck Regulator, TO-220-5; ki_fp_filters: TO?220*; Footprint: Package_TO_SOT_THT:TO-220-5_Vertical; Datasheet: http://ww1.microchip.com/downloads/en/DeviceDoc/lm2575.pdf
pins: 1 VIN, 2 OUT, 3 GND, 4 FB, 5 ~{{ON}/OFF}

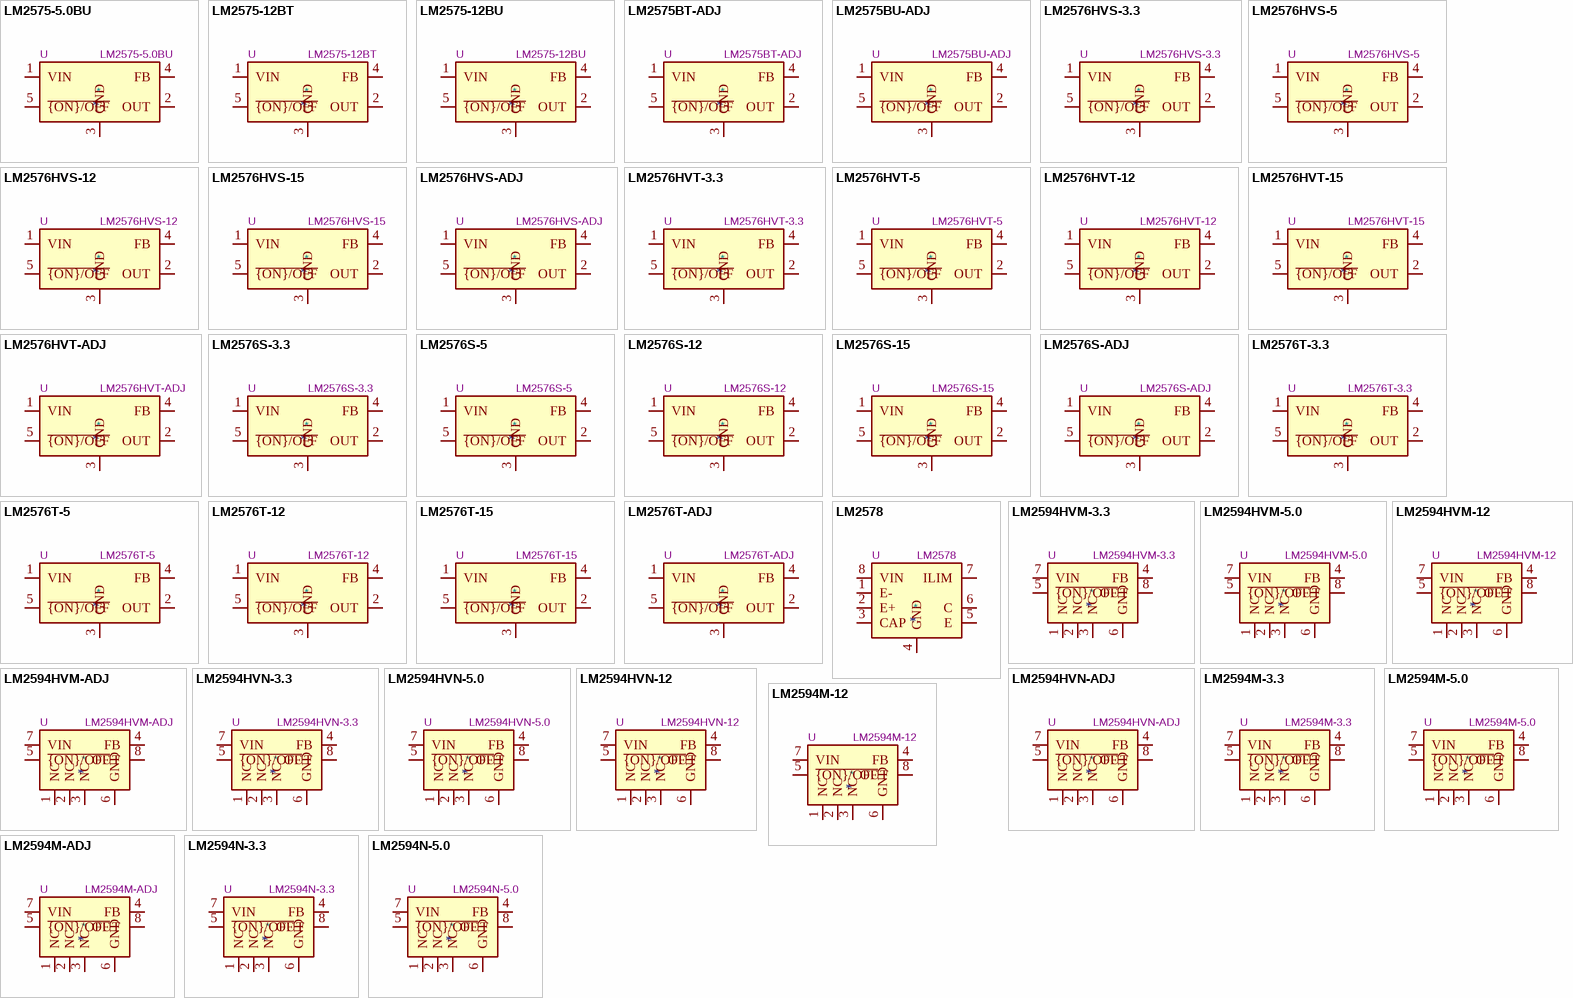
[diagram p4: symbols LM2575-5.0BU to LM2594N-5.0]

## LM2575-5.0BU
designator *  value LM2575-5.0BU  Reference: U
ki_keywords: Buck regulator Switcher; ki_description: Fixed 5.0V 52kHz Simple 1A Buck Regulator, TO-263; ki_fp_filters: TO?263*; Footprint: Package_TO_SOT_SMD:TO-263-5_TabPin3; Datasheet: http://ww1.microchip.com/downloads/en/DeviceDoc/lm2575.pdf
pins: 1 VIN, 2 OUT, 3 GND, 4 FB, 5 ~{{ON}/OFF}

## LM2575-12BT
designator *  value LM2575-12BT  Reference: U
ki_keywords: Buck regulator Switcher; ki_description: Fixed 12V 52kHz Simple 1A Buck Regulator, TO-220-5; ki_fp_filters: TO?220*; Footprint: Package_TO_SOT_THT:TO-220-5_Vertical; Datasheet: http://ww1.microchip.com/downloads/en/DeviceDoc/lm2575.pdf
pins: 1 VIN, 2 OUT, 3 GND, 4 FB, 5 ~{{ON}/OFF}

## LM2575-12BU
designator *  value LM2575-12BU  Reference: U
ki_keywords: Buck regulator Switcher; ki_description: Fixed 12V 52kHz Simple 1A Buck Regulator, TO-263; ki_fp_filters: TO?263*; Footprint: Package_TO_SOT_SMD:TO-263-5_TabPin3; Datasheet: http://ww1.microchip.com/downloads/en/DeviceDoc/lm2575.pdf
pins: 1 VIN, 2 OUT, 3 GND, 4 FB, 5 ~{{ON}/OFF}

## LM2575BT-ADJ
designator *  value LM2575BT-ADJ  Reference: U
ki_keywords: Buck regulator Switcher; ki_description: Adjustable 52kHz Simple 1A Buck Regulator, TO-220-5; ki_fp_filters: TO?220*; Footprint: Package_TO_SOT_THT:TO-220-5_Vertical; Datasheet: http://ww1.microchip.com/downloads/en/DeviceDoc/lm2575.pdf
pins: 1 VIN, 2 OUT, 3 GND, 4 FB, 5 ~{{ON}/OFF}

## LM2575BU-ADJ
designator *  value LM2575BU-ADJ  Reference: U
ki_keywords: Buck Regulator Switcher; ki_description: Adjustable 52kHz Simple 1A Buck Regulator, TO-263; ki_fp_filters: TO?263*; Footprint: Package_TO_SOT_SMD:TO-263-5_TabPin3; Datasheet: http://ww1.microchip.com/downloads/en/DeviceDoc/lm2575.pdf
pins: 1 VIN, 2 OUT, 3 GND, 4 FB, 5 ~{{ON}/OFF}

## LM2576HVS-3.3
designator *  value LM2576HVS-3.3  Reference: U
ki_keywords: Step-Down Voltage Regulator 3.3V 3A High Voltage; ki_description: 3.3V, 3A, SIMPLE SWITCHER® Step-Down Voltage Regulator, High Voltage Input, TO-263; ki_fp_filters: TO?263*; Footprint: Package_TO_SOT_SMD:TO-263-5_TabPin3; Datasheet: http://www.ti.com/lit/ds/symlink/lm2576.pdf
pins: 1 VIN, 2 OUT, 3 GND, 4 FB, 5 ~{{ON}/OFF}

## LM2576HVS-5
designator *  value LM2576HVS-5  Reference: U
ki_keywords: Step-Down Voltage Regulator 5V 3A High Voltage; ki_description: 5V 3A, SIMPLE SWITCHER® Step-Down Voltage Regulator, High Voltage Input, TO-263; ki_fp_filters: TO?263*; Footprint: Package_TO_SOT_SMD:TO-263-5_TabPin3; Datasheet: http://www.ti.com/lit/ds/symlink/lm2576.pdf
pins: 1 VIN, 2 OUT, 3 GND, 4 FB, 5 ~{{ON}/OFF}

## LM2576HVS-12
designator *  value LM2576HVS-12  Reference: U
ki_keywords: Step-Down Voltage Regulator 12V 3A High Voltage; ki_description: 12V, 3A SIMPLE SWITCHER® Step-Down Voltage Regulator, High Voltage Input, TO-263; ki_fp_filters: TO?263*; Footprint: Package_TO_SOT_SMD:TO-263-5_TabPin3; Datasheet: http://www.ti.com/lit/ds/symlink/lm2576.pdf
pins: 1 VIN, 2 OUT, 3 GND, 4 FB, 5 ~{{ON}/OFF}

## LM2576HVS-15
designator *  value LM2576HVS-15  Reference: U
ki_keywords: Step-Down Voltage Regulator 15V 3A High Voltage; ki_description: 15V, 3A SIMPLE SWITCHER® Step-Down Voltage Regulator, High Voltage Input, TO-263; ki_fp_filters: TO?263*; Footprint: Package_TO_SOT_SMD:TO-263-5_TabPin3; Datasheet: http://www.ti.com/lit/ds/symlink/lm2576.pdf
pins: 1 VIN, 2 OUT, 3 GND, 4 FB, 5 ~{{ON}/OFF}

## LM2576HVS-ADJ
designator *  value LM2576HVS-ADJ  Reference: U
ki_keywords: Step-Down Voltage Regulator 3A Adjustable High Voltage; ki_description: Adjustable Output Voltage, 3A SIMPLE SWITCHER® Step-Down Voltage Regulator, High Voltage Input, TO-263; ki_fp_filters: TO?263*; Footprint: Package_TO_SOT_SMD:TO-263-5_TabPin3; Datasheet: http://www.ti.com/lit/ds/symlink/lm2576.pdf
pins: 1 VIN, 2 OUT, 3 GND, 4 FB, 5 ~{{ON}/OFF}

## LM2576HVT-3.3
designator *  value LM2576HVT-3.3  Reference: U
ki_keywords: Step-Down Voltage Regulator 3.3V 3A High Voltage; ki_description: 3.3V, 3A SIMPLE SWITCHER® Step-Down Voltage Regulator, High Voltage Input, TO-220-5; ki_fp_filters: TO?220*; Footprint: Package_TO_SOT_THT:TO-220-5_Vertical; Datasheet: http://www.ti.com/lit/ds/symlink/lm2576.pdf
pins: 1 VIN, 2 OUT, 3 GND, 4 FB, 5 ~{{ON}/OFF}

## LM2576HVT-5
designator *  value LM2576HVT-5  Reference: U
ki_keywords: Step-Down Voltage Regulator 5V 3A High Voltage; ki_description: 5V, 3A SIMPLE SWITCHER® Step-Down Voltage Regulator, High Voltage Input, TO-220-5; ki_fp_filters: TO?220*; Footprint: Package_TO_SOT_THT:TO-220-5_Vertical; Datasheet: http://www.ti.com/lit/ds/symlink/lm2576.pdf
pins: 1 VIN, 2 OUT, 3 GND, 4 FB, 5 ~{{ON}/OFF}